# Altium schematic symbol library FPGA_Xilinx_Virtex5.SchLib: 41 symbols (part 15 of 17) (continued)
## XC5VSX240T-FF1738 (continued)
part V pins: A19 GND, A23 GND, A28 GND, A33 GND, A38 GND, AA12 VCCAUX, AA14 VCCINT, AA16 VCCINT, AA18 VCCINT, AA20 VCCINT, AA24 VCCINT, AA26 VCCINT, AA28 VCCINT, AA30 VCCAUX, AB13 VCCINT, AB15 VCCINT, AB17 VCCINT, AB19 VCCINT, AB23 VCCINT, AB25 VCCINT, AB27 VCCINT, AB29 VCCINT, AB31 VCCAUX, AC12 VCCAUX, AC14 VCCINT, AC16 VCCINT, AC18 VCCINT, AC20 VCCINT, AC24 VCCINT, AC26 VCCINT, AC28 VCCINT, AC30 VCCAUX, AD13 VCCINT, AD15 VCCINT, AD17 VCCINT, AD19 VCCINT, AD21 VCCINT, AD23 VCCINT, AD25 VCCINT, AD27 VCCINT, AD29 VCCINT, AD31 VCCAUX, AE12 VCCAUX, AE14 VCCINT, AE16 VCCINT, AE18 VCCINT, AE20 VCCINT, AE22 VCCINT, AE24 VCCINT, AE26 VCCINT, AE28 VCCINT, AE30 VCCAUX, AF13 VCCAUX, AF15 VCCINT, AF17 VCCINT, AF19 VCCINT, AF21 VCCINT, AF23 VCCINT, AF25 VCCINT, AF27 VCCINT, AF29 VCCAUX, AG14 VCCINT, AG16 VCCINT, AG18 VCCINT, AG20 VCCINT, AG22 VCCINT, AG24 VCCINT, AG26 VCCINT, AG28 VCCINT, AH13 VCCAUX, AH17 VCCINT, AH19 VCCINT, AH21 VCCINT, AH23 VCCINT, AH25 VCCINT, AH27 VCCINT, AJ12 VCCAUX, AJ18 VCCINT, AJ20 VCCINT, AJ24 VCCINT, B3 GND, B4 GND, B9 GND, B10 GND, B15 GND, B16 GND, B19 GND, B20 GND, B30 GND, B40 GND, C19 GND, C27 GND, C37 GND, C42 GND, D6 GND, D8 GND, D11 GND, D14 GND, D17 GND, D24 GND, D34 GND, E4 GND, E11 GND, E16 GND, E21 GND, E31 GND, E41 GND, F2 GND, F8 GND, F18 GND, F28 GND, F38 GND, G2 GND, G5 GND, G15 GND, G25 GND, G35 GND, H4 GND, H12 GND, H22 GND, H32 GND, H42 GND, J4 GND, J9 GND, J19 GND, J24 GND, J29 GND, J39 GND, K6 GND, K11 GND, K16 GND, K21 GND, K26 GND, K31 GND, K36 GND, L4 GND, L13 GND, L18 GND, L23 GND, L28 GND, L33 GND, M2 GND, M5 GND, M10 GND, M15 GND, M20 GND, M25 GND, M30 GND, M35 GND, M40 GND, N2 GND, N7 GND, N12 GND, N17 GND, N27 GND, N32 GND, N37 GND, N42 GND, P4 GND, P14 GND, P16 GND, P19 GND, P21 VCCINT, P22 GND, P23 VCCINT, P24 GND, P29 GND, P30 VBATT_0, P34 GND, R11 GND, R12 VCCAUX, R13 GND, R16 VCCINT, R17 GND, R18 VCCINT, R19 GND, R20 VCCINT, R21 GND, R22 VCCINT, R23 GND, R24 VCCINT, R25 GND, R26 VCCINT, R27 GND, R28 VCCINT, R31 GND, T13 VCCAUX, T15 VCCINT, T17 VCCINT, T19 VCCINT, T21 VCCINT, T23 VCCINT, T25 VCCINT, T27 VCCINT, T29 VCCAUX, U12 VCCAUX, U14 VCCINT, U16 VCCINT, U18 VCCINT, U20 VCCINT, U22 VCCINT, U24 VCCINT, U26 VCCINT, U28 VCCINT, U30 VCCAUX, V13 VCCINT, V15 VCCINT, V17 VCCINT, V19 VCCINT, V21 VCCINT, V23 VCCINT, V25 VCCINT, V27 VCCINT, V29 VCCINT, W12 VCCAUX, W14 VCCINT, W16 VCCINT, W18 VCCINT, W20 VCCINT, W22 VCCINT, W24 VCCINT, W26 VCCINT, W28 VCCINT, W30 VCCAUX, Y13 VCCINT, Y15 VCCINT, Y17 VCCINT, Y19 VCCINT, Y21 AVSS_0, Y22 AVDD_0, Y23 VCCINT, Y25 VCCINT, Y27 VCCINT, Y29 VCCINT, Y31 VCCAUX
part W pins: AA13 GND, AA15 GND, AA17 GND, AA19 GND, AA23 GND, AA25 GND, AA27 GND, AA29 GND, AA31 GND, AA33 GND, AB5 GND, AB10 GND, AB12 GND, AB14 GND, AB16 GND, AB18 GND, AB20 GND, AB24 GND, AB26 GND, AB28 GND, AB30 GND, AB40 GND, AC4 GND, AC7 GND, AC11 GND, AC13 GND, AC15 GND, AC17 GND, AC19 GND, AC23 GND, AC25 GND, AC27 GND, AC29 GND, AC31 GND, AC32 GND, AC37 GND, AC42 GND, AD2 GND, AD12 GND, AD14 GND, AD16 GND, AD18 GND, AD20 GND, AD22 GND, AD24 GND, AD26 GND, AD28 GND, AD30 GND, AD34 GND, AE2 GND, AE11 GND, AE13 GND, AE15 GND, AE17 GND, AE19 GND, AE21 GND, AE23 GND, AE25 GND, AE27 GND, AE29 GND, AE31 GND, AE41 GND, AF4 GND, AF8 GND, AF14 GND, AF16 GND, AF18 GND, AF20 GND, AF22 GND, AF24 GND, AF26 GND, AF28 GND, AF33 GND, AF38 GND, AG5 GND, AG13 GND, AG15 GND, AG17 GND, AG19 GND, AG21 GND, AG23 GND, AG25 GND, AG27 GND, AG35 GND, AH12 GND, AH18 GND, AH20 GND, AH22 GND, AH24 GND, AH26 GND, AH28 GND, AH32 GND, AH42 GND, AJ4 GND, AJ9 GND, AJ13 GND, AJ14 GND, AJ17 GND, AJ19 GND, AJ23 GND, AJ25 GND, AJ27 GND, AJ29 GND, AJ39 GND, AK2 GND, AK6 GND, AK16 GND, AK21 GND, AK26 GND, AK31 GND, AK36 GND, AL2 GND, AL13 GND, AL18 GND, AL23 GND, AL33 GND, AM4 GND, AM5 GND, AM10 GND, AM15 GND, AM20 GND, AM25 GND, AM30 GND, AM40 GND, AN7 GND, AN12 GND, AN17 GND, AN22 GND, AN27 GND, AN32 GND, AN37 GND, AN42 GND, AP4 GND, AP14 GND, AP24 GND, AP29 GND, AP34 GND, AR4 GND, AR6 GND, AR11 GND, AR21 GND, AR31 GND, AR41 GND, AT2 GND, AT8 GND, AT18 GND, AT28 GND, AT38 GND, AU2 GND, AU5 GND, AU15 GND, AU25 GND, AU35 GND, AV4 GND, AV12 GND, AV22 GND, AV32 GND, AV42 GND, AW6 GND, AW8 GND, AW11 GND, AW14 GND, AW17 GND, AW19 GND, AW29 GND, AW39 GND, AY26 GND, AY36 GND, AY41 GND, BA3 GND, BA4 GND, BA9 GND, BA10 GND, BA15 GND, BA16 GND, BA23 GND, BA33 GND, BA38 GND, BB19 GND, BB25 GND, BB30 GND, BB35 GND, BB40 GND, R41 GND, T8 GND, T12 GND, T16 GND, T18 GND, T20 GND, T22 GND, T24 GND, T26 GND, T28 GND, T33 GND, T38 GND, U4 GND, U5 GND, U13 GND, U15 GND, U17 GND, U19 GND, U21 GND, U23 GND, U25 GND, U27 GND, U29 GND, U35 GND, V2 GND, V12 GND, V14 GND, V16 GND, V18 GND, V20 GND, V22 GND, V24 GND, V26 GND, V28 GND, V30 GND, V32 GND, V42 GND, W2 GND, W9 GND, W13 GND, W15 GND, W17 GND, W19 GND, W21 GND, W23 GND, W25 GND, W27 GND, W29 GND, W31 GND, W34 GND, W39 GND, Y4 GND, Y6 GND, Y11 GND, Y12 GND, Y14 GND, Y16 GND, Y18 GND, Y20 GND, Y24 GND, Y26 GND, Y28 GND, Y30 GND, Y36 GND

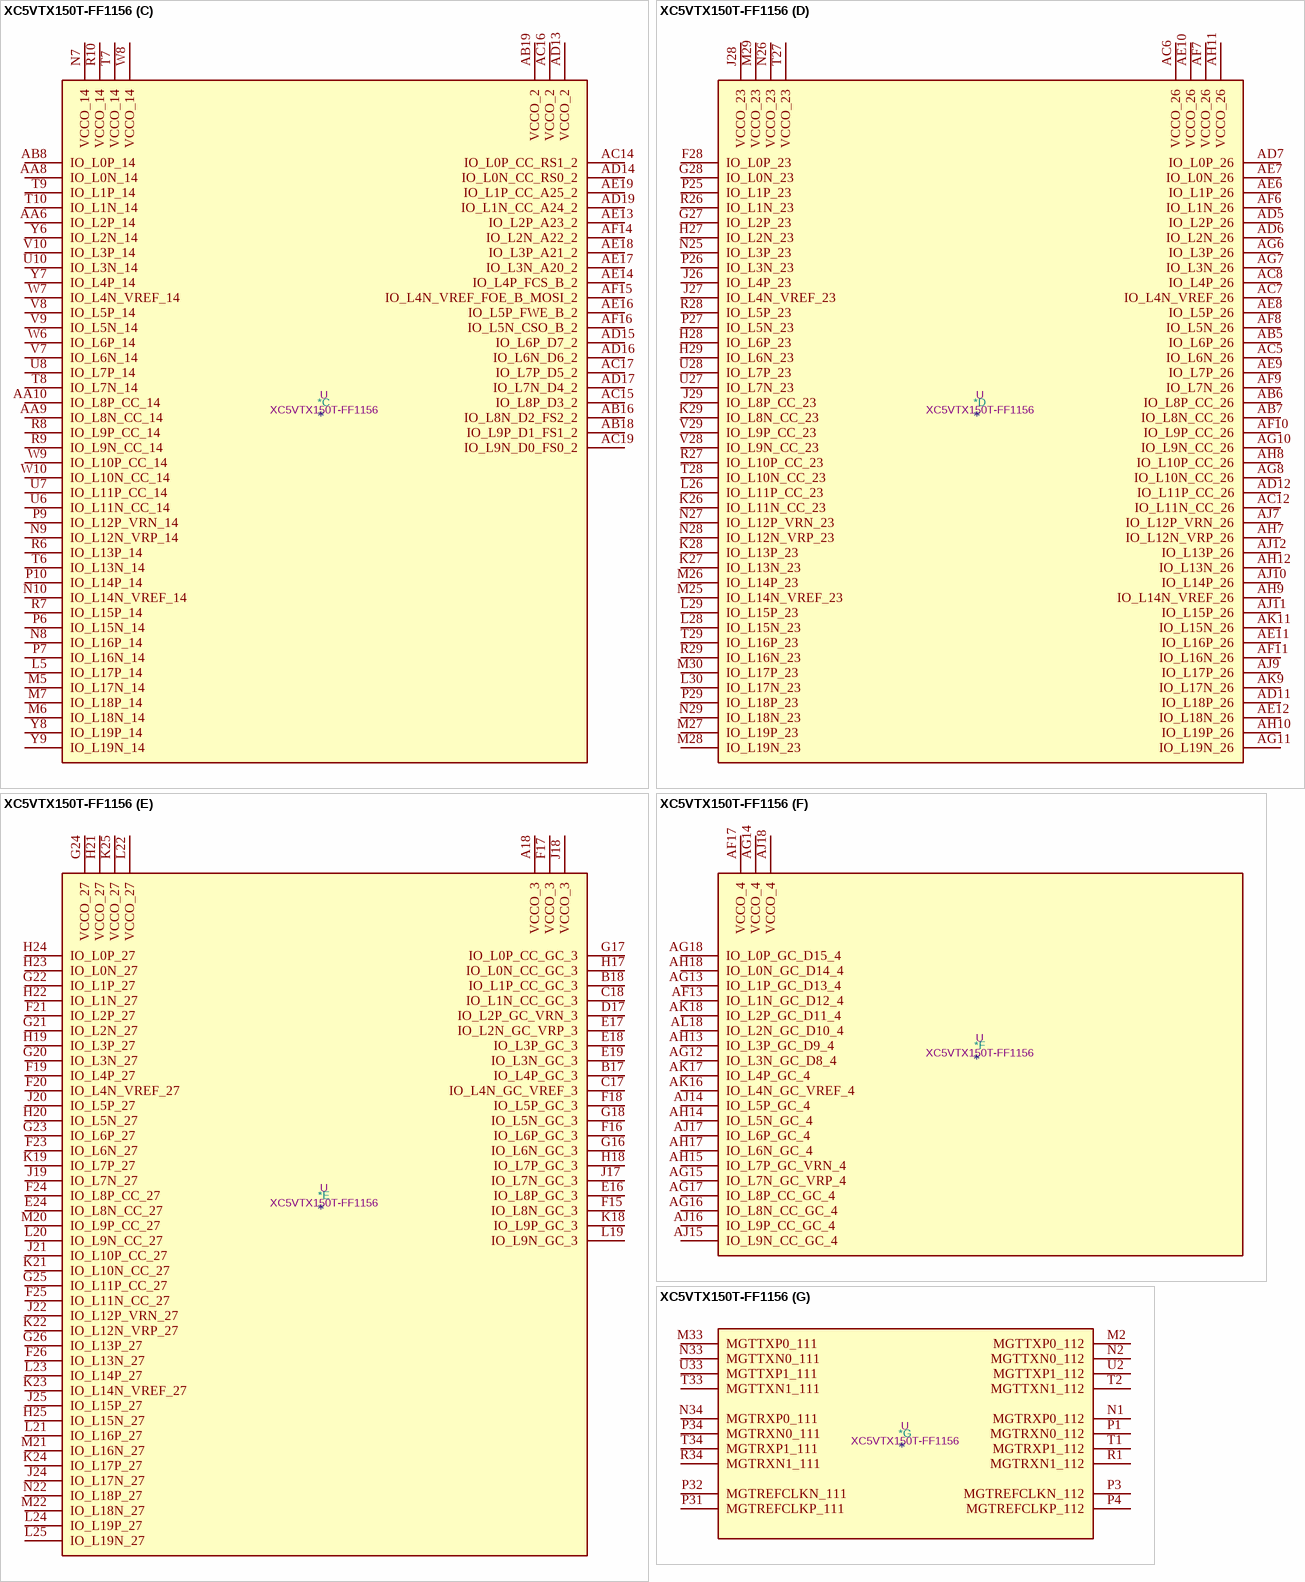
[diagram p126: symbol XC5VTX150T-FF1156]

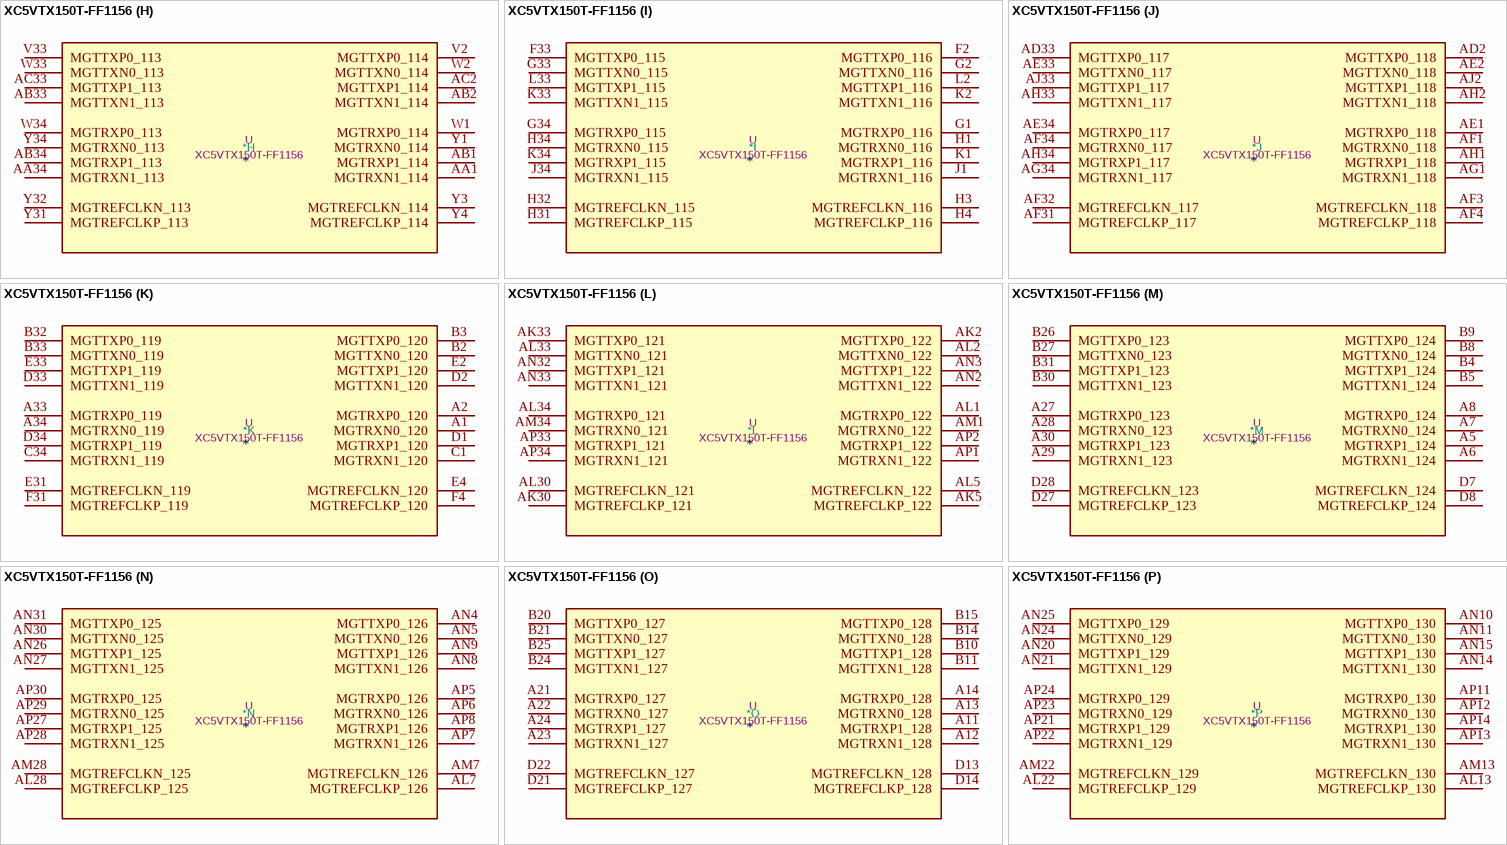
[diagram p127: symbol XC5VTX150T-FF1156]

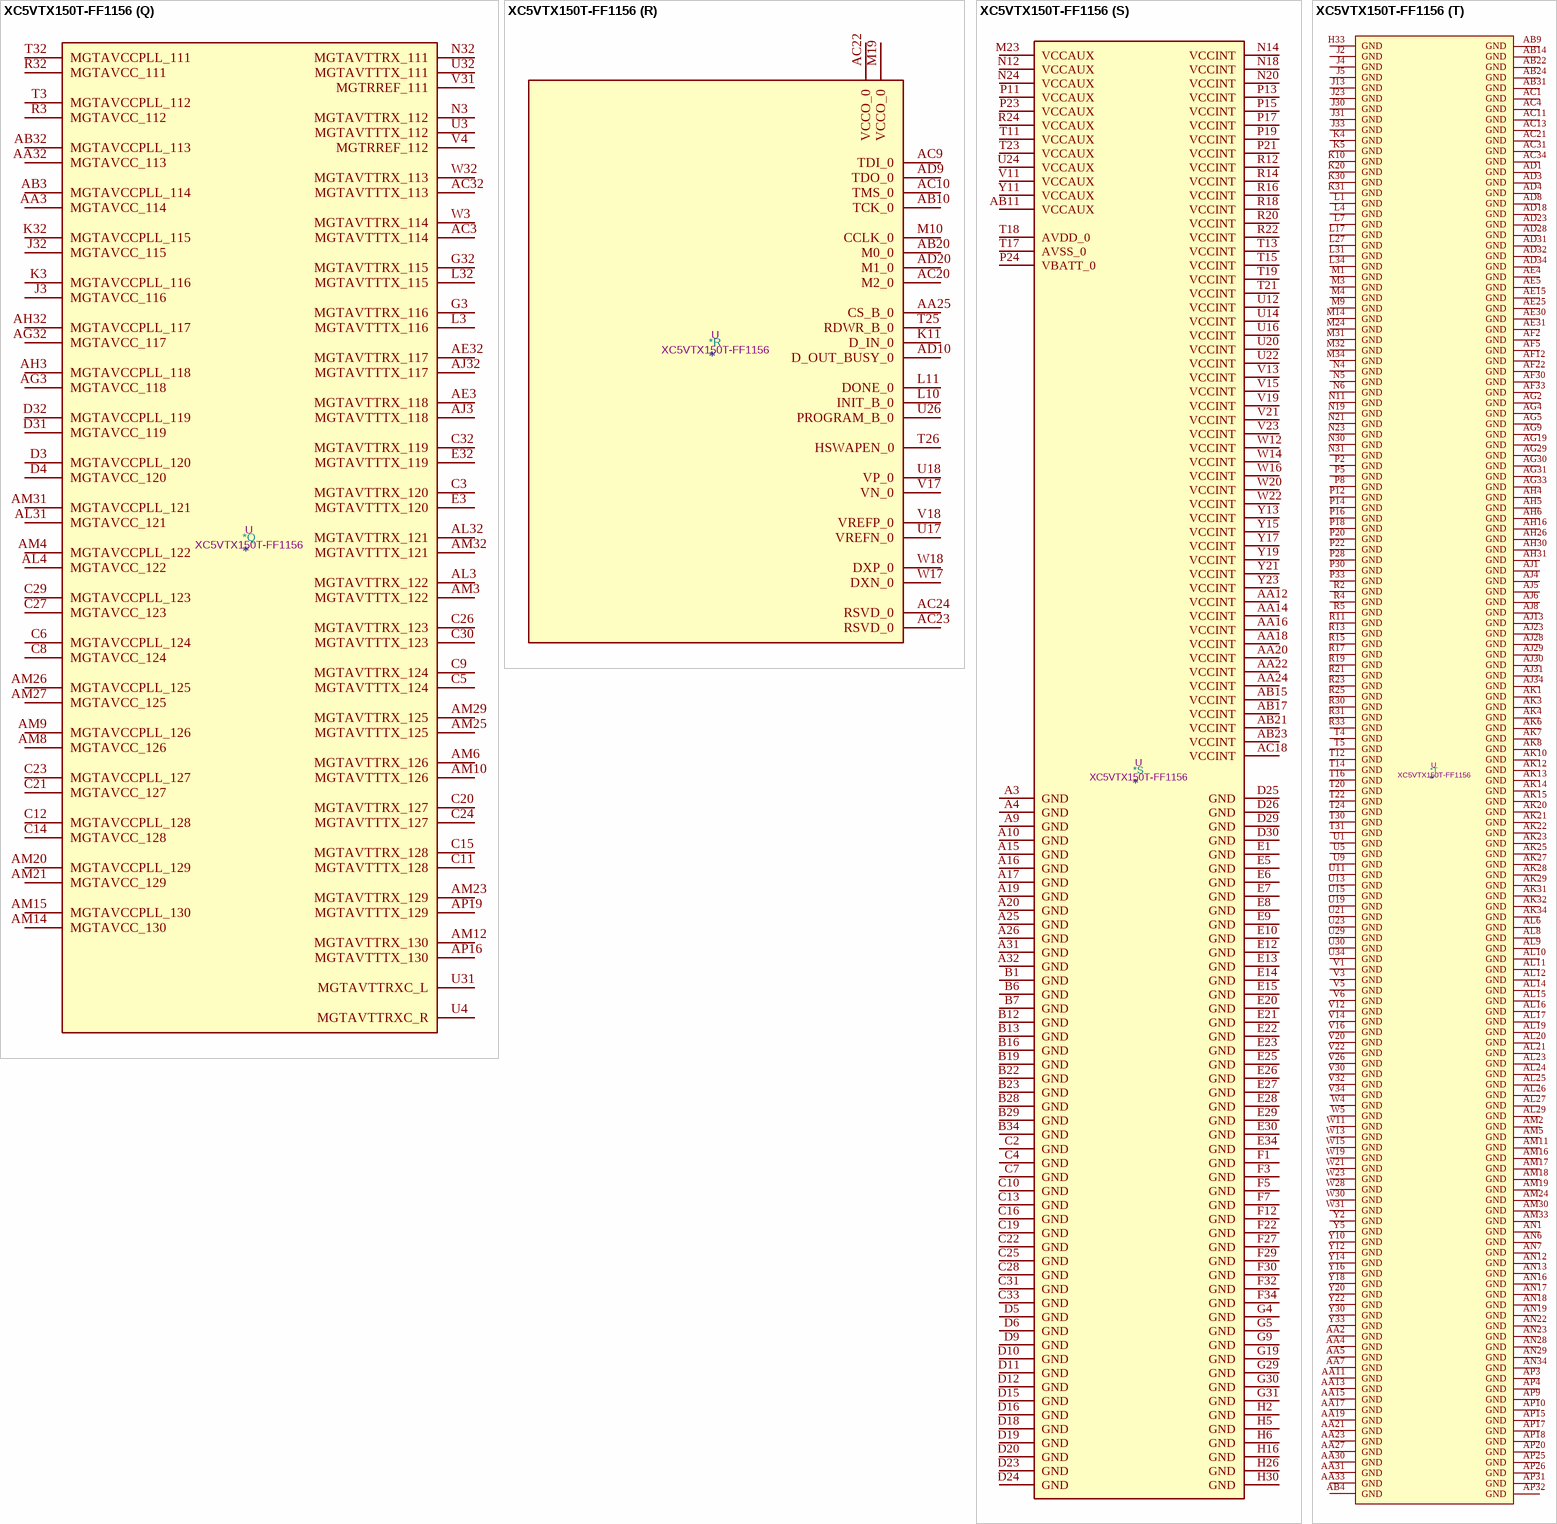
[diagram p128: symbol XC5VTX150T-FF1156]

## XC5VTX150T-FF1156
designator *  value XC5VTX150T-FF1156  Reference: U
ki_keywords: FPGA; ki_description: Virtex 5 TXT 150 XC5VTX150T-FF1156
part A pins: AA26 IO_L13P_11, AA28 IO_L7P_11, AA29 IO_L7N_11, AB25 IO_L15P_SM13P_11, AB26 IO_L13N_11, AB27 IO_L11P_CC_SM14P_11, AB28 IO_L3N_11, AB29 VCCO_11, AB30 IO_L14P_11, AC25 IO_L15N_SM13N_11, AC26 VCCO_11, AC27 IO_L11N_CC_SM14N_11, AC28 IO_L3P_11, AC29 IO_L12N_VRP_11, AC30 IO_L14N_VREF_11, AD25 IO_L0P_11, AD26 IO_L2P_11, AD27 IO_L2N_11, AD29 IO_L5N_11, AD30 IO_L12P_VRN_11, AE26 IO_L0N_11, AE27 IO_L1N_11, AE28 IO_L5P_11, AE29 IO_L10N_CC_SM15N_11, AF27 VCCO_11, AF28 IO_L1P_11, AF29 IO_L10P_CC_SM15P_11, AG28 IO_L9P_CC_11, AH29 IO_L9N_CC_11, H15 IO_L1P_A17_1, J15 IO_L1N_A16_1, J16 IO_L0N_A18_1, K15 VCCO_1, K16 IO_L2N_A14_D30_1, K17 IO_L0P_A19_1, L12 VCCO_1, L13 IO_L5N_A8_D24_1, L14 IO_L5P_A9_D25_1, L15 IO_L4N_VREF_A10_D26_1, L16 IO_L2P_A15_D31_1, L18 IO_L6N_A6_D22_1, M11 IO_L7P_A5_D21_1, M12 IO_L7N_A4_D20_1, M13 IO_L9P_CC_A1_D17_1, M15 IO_L3P_A13_D29_1, M16 IO_L4P_A11_D27_1, M17 IO_L6P_A7_D23_1, M18 IO_L8P_CC_A3_D19_1, N13 IO_L9N_CC_A0_D16_1, N15 IO_L3N_A12_D28_1, N16 VCCO_1, N17 IO_L8N_CC_A2_D18_1, U25 IO_L8P_CC_11, V24 IO_L19P_SM9P_11, V25 IO_L8N_CC_11, V27 IO_L4N_VREF_11, W24 IO_L18N_SM10N_11, W25 IO_L19N_SM9N_11, W26 IO_L17N_SM11N_11, W27 IO_L4P_11, W29 IO_L16P_SM12P_11, Y24 IO_L18P_SM10P_11, Y25 VCCO_11, Y26 IO_L17P_SM11P_11, Y27 IO_L6N_11, Y28 IO_L6P_11, Y29 IO_L16N_SM12N_11
part B pins: AD21 IO_L1P_SM7P_13, AD22 IO_L3P_SM5P_13, AD24 IO_L16N_13, AE20 VCCO_13, AE21 IO_L1N_SM7N_13, AE22 IO_L3N_SM5N_13, AE23 IO_L16P_13, AE24 IO_L8P_CC_SM1P_13, AF18 IO_L5N_SM4N_13, AF19 IO_L5P_SM4P_13, AF20 IO_L10P_CC_13, AF21 IO_L14P_13, AF23 IO_L18N_13, AF24 IO_L18P_13, AF25 IO_L8N_CC_SM1N_13, AF26 IO_L0P_SM8P_13, AG20 IO_L10N_CC_13, AG21 IO_L14N_VREF_13, AG22 IO_L17P_13, AG23 IO_L17N_13, AG24 VCCO_13, AG25 IO_L13N_13, AG26 IO_L2P_SM6P_13, AG27 IO_L0N_SM8N_13, AH19 IO_L7N_SM2N_13, AH20 IO_L7P_SM2P_13, AH21 VCCO_13, AH22 IO_L19N_13, AH23 IO_L15P_13, AH24 IO_L15N_13, AH25 IO_L13P_13, AH27 IO_L2N_SM6N_13, AH28 IO_L4P_13, AJ19 IO_L9N_CC_SM0N_13, AJ20 IO_L12P_VRN_13, AJ21 IO_L12N_VRP_13, AJ22 IO_L19P_13, AJ24 IO_L11P_CC_13, AJ25 IO_L6P_SM3P_13, AJ26 VCCO_13, AJ27 IO_L4N_VREF_13, AK19 IO_L9P_CC_SM0P_13, AK24 IO_L11N_CC_13, AK26 IO_L6N_SM3N_13, E11 IO_L4N_VREF_12, F6 IO_L7P_12, F8 IO_L0N_12, F9 IO_L0P_12, F10 IO_L2P_12, F11 IO_L4P_12, F13 IO_L13P_12, F14 IO_L13N_12, G6 IO_L7N_12, G7 VCCO_12, G8 IO_L5P_12, G10 IO_L2N_12, G11 IO_L6N_12, G12 IO_L6P_12, G13 IO_L11N_CC_12, G14 VCCO_12, G15 IO_L15P_12, H7 IO_L9P_CC_12, H8 IO_L5N_12, H9 IO_L3N_12, H10 IO_L3P_12, H11 VCCO_12, H12 IO_L11P_CC_12, H13 IO_L17P_12, H14 IO_L15N_12, J6 IO_L12N_VRP_12, J7 IO_L9N_CC_12, J8 VCCO_12, J9 IO_L10N_CC_12, J10 IO_L1N_12, J11 IO_L1P_12, J12 IO_L8N_CC_12, J14 IO_L17N_12, K6 IO_L12P_VRN_12, K7 IO_L18N_12, K8 IO_L10P_CC_12, K9 IO_L14N_VREF_12, K12 IO_L8P_CC_12, K13 IO_L19P_12, K14 IO_L19N_12, L6 IO_L18P_12, L8 IO_L14P_12, L9 IO_L16N_12, M8 IO_L16P_12
part C pins: AA6 IO_L2P_14, AA8 IO_L0N_14, AA9 IO_L8N_CC_14, AA10 IO_L8P_CC_14, AB8 IO_L0P_14, AB16 IO_L8N_D2_FS2_2, AB18 IO_L9P_D1_FS1_2, AB19 VCCO_2, AC14 IO_L0P_CC_RS1_2, AC15 IO_L8P_D3_2, AC16 VCCO_2, AC17 IO_L7P_D5_2, AC19 IO_L9N_D0_FS0_2, AD13 VCCO_2, AD14 IO_L0N_CC_RS0_2, AD15 IO_L6P_D7_2, AD16 IO_L6N_D6_2, AD17 IO_L7N_D4_2, AD19 IO_L1N_CC_A24_2, AE13 IO_L2P_A23_2, AE14 IO_L4P_FCS_B_2, AE16 IO_L5P_FWE_B_2, AE17 IO_L3N_A20_2, AE18 IO_L3P_A21_2, AE19 IO_L1P_CC_A25_2, AF14 IO_L2N_A22_2, AF15 IO_L4N_VREF_FOE_B_MOSI_2, AF16 IO_L5N_CSO_B_2, L5 IO_L17P_14, M5 IO_L17N_14, M6 IO_L18N_14, M7 IO_L18P_14, N7 VCCO_14, N8 IO_L16P_14, N9 IO_L12N_VRP_14, N10 IO_L14N_VREF_14, P6 IO_L15N_14, P7 IO_L16N_14, P9 IO_L12P_VRN_14, P10 IO_L14P_14, R6 IO_L13P_14, R7 IO_L15P_14, R8 IO_L9P_CC_14, R9 IO_L9N_CC_14, R10 VCCO_14, T6 IO_L13N_14, T7 VCCO_14, T8 IO_L7N_14, T9 IO_L1P_14, T10 IO_L1N_14, U6 IO_L11N_CC_14, U7 IO_L11P_CC_14, U8 IO_L7P_14, U10 IO_L3N_14, V7 IO_L6N_14, V8 IO_L5P_14, V9 IO_L5N_14, V10 IO_L3P_14, W6 IO_L6P_14, W7 IO_L4N_VREF_14, W8 VCCO_14, W9 IO_L10P_CC_14, W10 IO_L10N_CC_14, Y6 IO_L2N_14, Y7 IO_L4P_14, Y8 IO_L19P_14, Y9 IO_L19N_14
part D pins: AB5 IO_L6P_26, AB6 IO_L8P_CC_26, AB7 IO_L8N_CC_26, AC5 IO_L6N_26, AC6 VCCO_26, AC7 IO_L4N_VREF_26, AC8 IO_L4P_26, AC12 IO_L11N_CC_26, AD5 IO_L2P_26, AD6 IO_L2N_26, AD7 IO_L0P_26, AD11 IO_L18P_26, AD12 IO_L11P_CC_26, AE6 IO_L1P_26, AE7 IO_L0N_26, AE8 IO_L5P_26, AE9 IO_L7P_26, AE10 VCCO_26, AE11 IO_L16P_26, AE12 IO_L18N_26, AF6 IO_L1N_26, AF7 VCCO_26, AF8 IO_L5N_26, AF9 IO_L7N_26, AF10 IO_L9P_CC_26, AF11 IO_L16N_26, AG6 IO_L3P_26, AG7 IO_L3N_26, AG8 IO_L10N_CC_26, AG10 IO_L9N_CC_26, AG11 IO_L19N_26, AH7 IO_L12N_VRP_26, AH8 IO_L10P_CC_26, AH9 IO_L14N_VREF_26, AH10 IO_L19P_26, AH11 VCCO_26, AH12 IO_L13N_26, AJ7 IO_L12P_VRN_26, AJ9 IO_L17P_26, AJ10 IO_L14P_26, AJ11 IO_L15P_26, AJ12 IO_L13P_26, AK9 IO_L17N_26, AK11 IO_L15N_26, F28 IO_L0P_23, G27 IO_L2P_23, G28 IO_L0N_23, H27 IO_L2N_23, H28 IO_L6P_23, H29 IO_L6N_23, J26 IO_L4P_23, J27 IO_L4N_VREF_23, J28 VCCO_23, J29 IO_L8P_CC_23, K26 IO_L11N_CC_23, K27 IO_L13N_23, K28 IO_L13P_23, K29 IO_L8N_CC_23, L26 IO_L11P_CC_23, L28 IO_L15N_23, L29 IO_L15P_23, L30 IO_L17N_23, M25 IO_L14N_VREF_23, M26 IO_L14P_23, M27 IO_L19P_23, M28 IO_L19N_23, M29 VCCO_23, M30 IO_L17P_23, N25 IO_L3P_23, N26 VCCO_23, N27 IO_L12P_VRN_23, N28 IO_L12N_VRP_23, N29 IO_L18N_23, P25 IO_L1P_23, P26 IO_L3N_23, P27 IO_L5N_23, P29 IO_L18P_23, R26 IO_L1N_23, R27 IO_L10P_CC_23, R28 IO_L5P_23, R29 IO_L16N_23, T27 VCCO_23, T28 IO_L10N_CC_23, T29 IO_L16P_23, U27 IO_L7N_23, U28 IO_L7P_23, V28 IO_L9N_CC_23, V29 IO_L9P_CC_23
part E pins: A18 VCCO_3, B17 IO_L4P_GC_3, B18 IO_L1P_CC_GC_3, C17 IO_L4N_GC_VREF_3, C18 IO_L1N_CC_GC_3, D17 IO_L2P_GC_VRN_3, E16 IO_L8P_GC_3, E17 IO_L2N_GC_VRP_3, E18 IO_L3P_GC_3, E19 IO_L3N_GC_3, E24 IO_L8N_CC_27, F15 IO_L8N_GC_3, F16 IO_L6P_GC_3, F17 VCCO_3, F18 IO_L5P_GC_3, F19 IO_L4P_27, F20 IO_L4N_VREF_27, F21 IO_L2P_27, F23 IO_L6N_27, F24 IO_L8P_CC_27, F25 IO_L11N_CC_27, F26 IO_L13N_27, G16 IO_L6N_GC_3, G17 IO_L0P_CC_GC_3, G18 IO_L5N_GC_3, G20 IO_L3N_27, G21 IO_L2N_27, G22 IO_L1P_27, G23 IO_L6P_27, G24 VCCO_27, G25 IO_L11P_CC_27, G26 IO_L13P_27, H17 IO_L0N_CC_GC_3, H18 IO_L7P_GC_3, H19 IO_L3P_27, H20 IO_L5N_27, H21 VCCO_27, H22 IO_L1N_27, H23 IO_L0N_27, H24 IO_L0P_27, H25 IO_L15N_27, J17 IO_L7N_GC_3, J18 VCCO_3, J19 IO_L7N_27, J20 IO_L5P_27, J21 IO_L10P_CC_27, J22 IO_L12P_VRN_27, J24 IO_L17N_27, J25 IO_L15P_27, K18 IO_L9P_GC_3, K19 IO_L7P_27, K21 IO_L10N_CC_27, K22 IO_L12N_VRP_27, K23 IO_L14N_VREF_27, K24 IO_L17P_27, K25 VCCO_27, L19 IO_L9N_GC_3, L20 IO_L9N_CC_27, L21 IO_L16P_27, L22 VCCO_27, L23 IO_L14P_27, L24 IO_L19P_27, L25 IO_L19N_27, M20 IO_L9P_CC_27, M21 IO_L16N_27, M22 IO_L18N_27, N22 IO_L18P_27
part F pins: AF13 IO_L1N_GC_D12_4, AF17 VCCO_4, AG12 IO_L3N_GC_D8_4, AG13 IO_L1P_GC_D13_4, AG14 VCCO_4, AG15 IO_L7N_GC_VRP_4, AG16 IO_L8N_CC_GC_4, AG17 IO_L8P_CC_GC_4, AG18 IO_L0P_GC_D15_4, AH13 IO_L3P_GC_D9_4, AH14 IO_L5N_GC_4, AH15 IO_L7P_GC_VRN_4, AH17 IO_L6N_GC_4, AH18 IO_L0N_GC_D14_4, AJ14 IO_L5P_GC_4, AJ15 IO_L9N_CC_GC_4, AJ16 IO_L9P_CC_GC_4, AJ17 IO_L6P_GC_4, AJ18 VCCO_4, AK16 IO_L4N_GC_VREF_4, AK17 IO_L4P_GC_4, AK18 IO_L2P_GC_D11_4, AL18 IO_L2N_GC_D10_4
part G pins: M2 MGTTXP0_112, M33 MGTTXP0_111, N1 MGTRXP0_112, N2 MGTTXN0_112, N33 MGTTXN0_111, N34 MGTRXP0_111, P1 MGTRXN0_112, P3 MGTREFCLKN_112, P4 MGTREFCLKP_112, P31 MGTREFCLKP_111, P32 MGTREFCLKN_111, P34 MGTRXN0_111, R1 MGTRXN1_112, R34 MGTRXN1_111, T1 MGTRXP1_112, T2 MGTTXN1_112, T33 MGTTXN1_111, T34 MGTRXP1_111, U2 MGTTXP1_112, U33 MGTTXP1_111
part H pins: AA1 MGTRXN1_114, AA34 MGTRXN1_113, AB1 MGTRXP1_114, AB2 MGTTXN1_114, AB33 MGTTXN1_113, AB34 MGTRXP1_113, AC2 MGTTXP1_114, AC33 MGTTXP1_113, V2 MGTTXP0_114, V33 MGTTXP0_113, W1 MGTRXP0_114, W2 MGTTXN0_114, W33 MGTTXN0_113, W34 MGTRXP0_113, Y1 MGTRXN0_114, Y3 MGTREFCLKN_114, Y4 MGTREFCLKP_114, Y31 MGTREFCLKP_113, Y32 MGTREFCLKN_113, Y34 MGTRXN0_113
part I pins: F2 MGTTXP0_116, F33 MGTTXP0_115, G1 MGTRXP0_116, G2 MGTTXN0_116, G33 MGTTXN0_115, G34 MGTRXP0_115, H1 MGTRXN0_116, H3 MGTREFCLKN_116, H4 MGTREFCLKP_116, H31 MGTREFCLKP_115, H32 MGTREFCLKN_115, H34 MGTRXN0_115, J1 MGTRXN1_116, J34 MGTRXN1_115, K1 MGTRXP1_116, K2 MGTTXN1_116, K33 MGTTXN1_115, K34 MGTRXP1_115, L2 MGTTXP1_116, L33 MGTTXP1_115
part J pins: AD2 MGTTXP0_118, AD33 MGTTXP0_117, AE1 MGTRXP0_118, AE2 MGTTXN0_118, AE33 MGTTXN0_117, AE34 MGTRXP0_117, AF1 MGTRXN0_118, AF3 MGTREFCLKN_118, AF4 MGTREFCLKP_118, AF31 MGTREFCLKP_117, AF32 MGTREFCLKN_117, AF34 MGTRXN0_117, AG1 MGTRXN1_118, AG34 MGTRXN1_117, AH1 MGTRXP1_118, AH2 MGTTXN1_118, AH33 MGTTXN1_117, AH34 MGTRXP1_117, AJ2 MGTTXP1_118, AJ33 MGTTXP1_117
part K pins: A1 MGTRXN0_120, A2 MGTRXP0_120, A33 MGTRXP0_119, A34 MGTRXN0_119, B2 MGTTXN0_120, B3 MGTTXP0_120, B32 MGTTXP0_119, B33 MGTTXN0_119, C1 MGTRXN1_120, C34 MGTRXN1_119, D1 MGTRXP1_120, D2 MGTTXN1_120, D33 MGTTXN1_119, D34 MGTRXP1_119, E2 MGTTXP1_120, E4 MGTREFCLKN_120, E31 MGTREFCLKN_119, E33 MGTTXP1_119, F4 MGTREFCLKP_120, F31 MGTREFCLKP_119
part L pins: AK2 MGTTXP0_122, AK5 MGTREFCLKP_122, AK30 MGTREFCLKP_121, AK33 MGTTXP0_121, AL1 MGTRXP0_122, AL2 MGTTXN0_122, AL5 MGTREFCLKN_122, AL30 MGTREFCLKN_121, AL33 MGTTXN0_121, AL34 MGTRXP0_121, AM1 MGTRXN0_122, AM34 MGTRXN0_121, AN2 MGTTXN1_122, AN3 MGTTXP1_122, AN32 MGTTXP1_121, AN33 MGTTXN1_121, AP1 MGTRXN1_122, AP2 MGTRXP1_122, AP33 MGTRXP1_121, AP34 MGTRXN1_121
part M pins: A5 MGTRXP1_124, A6 MGTRXN1_124, A7 MGTRXN0_124, A8 MGTRXP0_124, A27 MGTRXP0_123, A28 MGTRXN0_123, A29 MGTRXN1_123, A30 MGTRXP1_123, B4 MGTTXP1_124, B5 MGTTXN1_124, B8 MGTTXN0_124, B9 MGTTXP0_124, B26 MGTTXP0_123, B27 MGTTXN0_123, B30 MGTTXN1_123, B31 MGTTXP1_123, D7 MGTREFCLKN_124, D8 MGTREFCLKP_124, D27 MGTREFCLKP_123, D28 MGTREFCLKN_123
part N pins: AL7 MGTREFCLKP_126, AL28 MGTREFCLKP_125, AM7 MGTREFCLKN_126, AM28 MGTREFCLKN_125, AN4 MGTTXP0_126, AN5 MGTTXN0_126, AN8 MGTTXN1_126, AN9 MGTTXP1_126, AN26 MGTTXP1_125, AN27 MGTTXN1_125, AN30 MGTTXN0_125, AN31 MGTTXP0_125, AP5 MGTRXP0_126, AP6 MGTRXN0_126, AP7 MGTRXN1_126, AP8 MGTRXP1_126, AP27 MGTRXP1_125, AP28 MGTRXN1_125, AP29 MGTRXN0_125, AP30 MGTRXP0_125